# Altium footprint library Roket_Library.PcbLib: 45 footprints (part 1 of 3)
Each footprint in its own frame and in the unit in brackets; x right, y up, seen from the top. Pads: shape width x height; smd on the part's side, far side on the other; paste and mask are expansions set on the pad; w line width, h text height; cw(c..) or ccw(c..) is an arc to the next point about the centre after c.
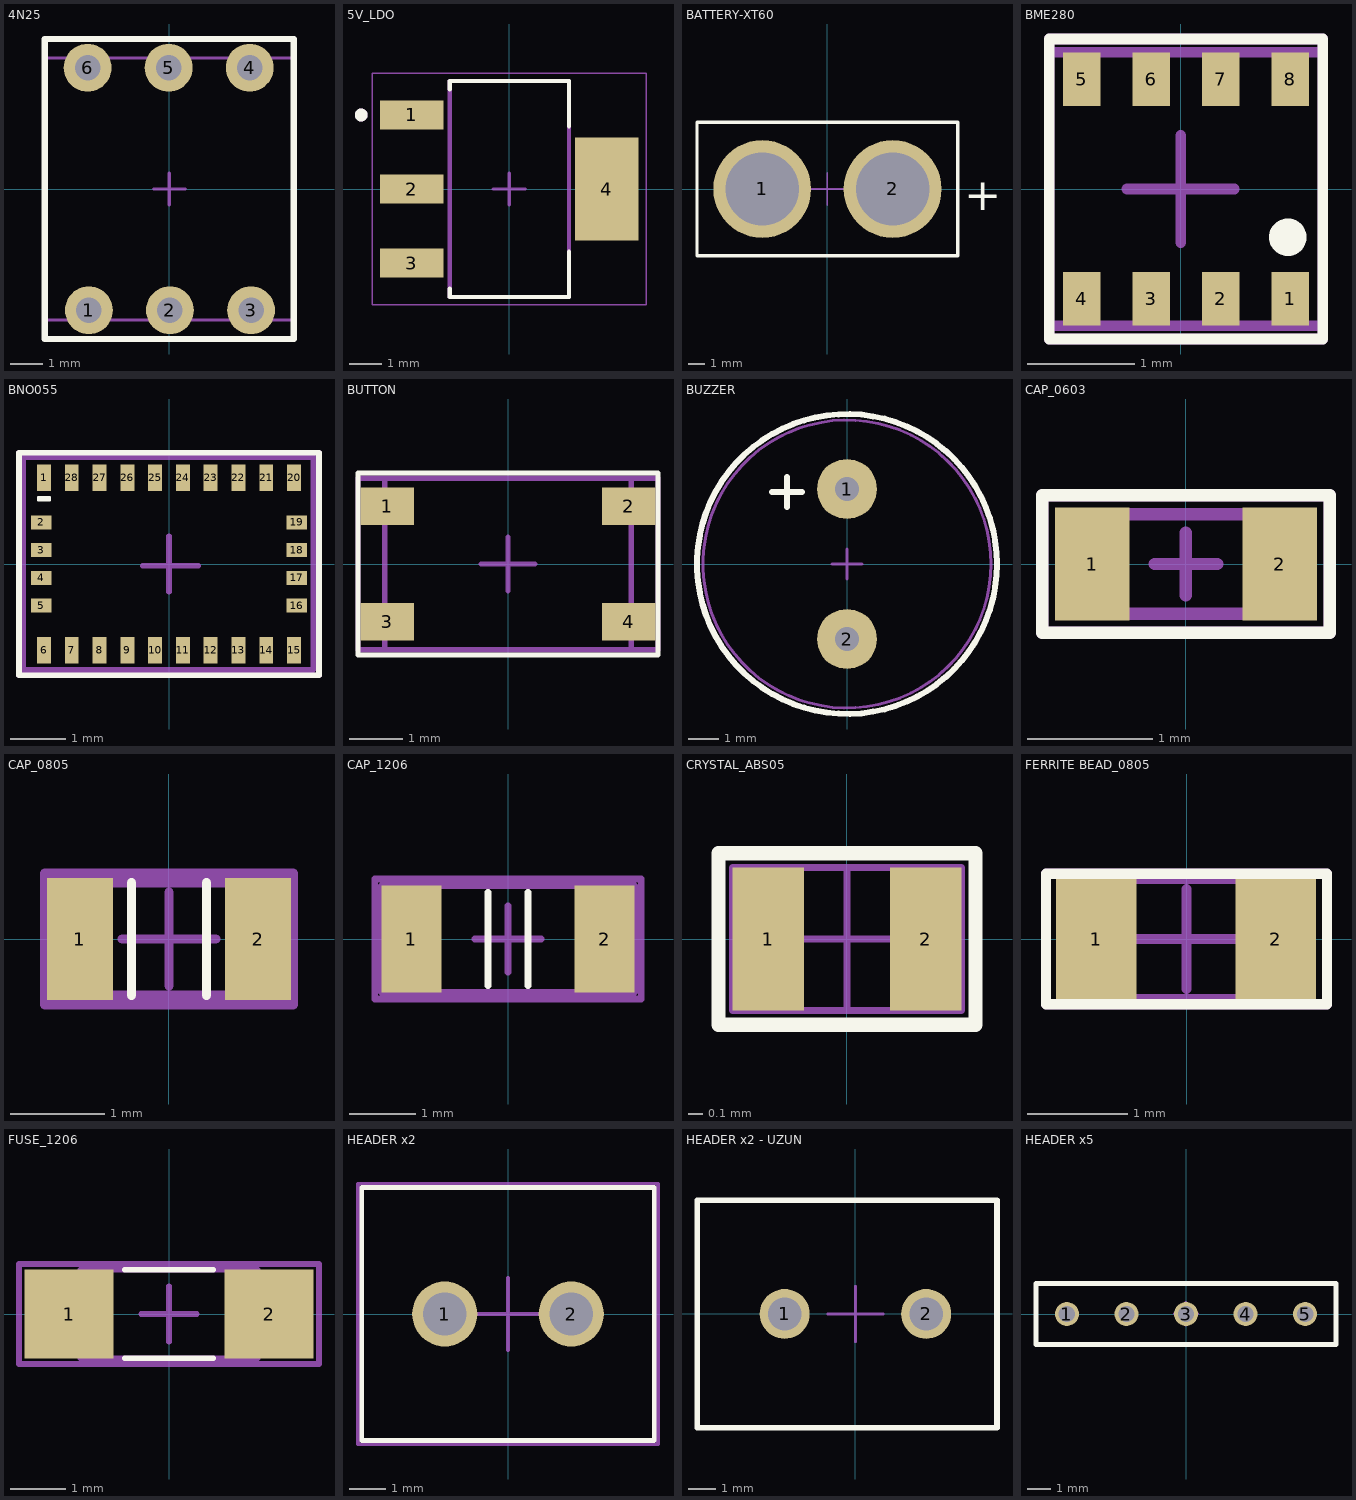
[diagram p0: the footprints below, top view; thin cyan lines are the x and y axes]

## 4N25 [mm]
pads (6):
  round 1.5 hole 0.8 mask+0.05: 1(-2.52,-3.8) 2(0.02,-3.8) 3(2.56,-3.8) 4(2.52,3.8) 5(-0.02,3.8) 6(-2.56,3.8)
Top Overlay:
  lines w0.2: -3.9,-4.7 -3.9,4.7 3.9,4.7 3.9,-4.7 -3.9,-4.7
Top 3D Body:
  lines w0.1: -3.92,-4.1 -3.92,4.1 3.88,4.1 3.88,-4.1 -3.92,-4.1
Top Component Center:
  lines w0.1: -0.5,0 0.5,0 ; 0,-0.5 0,0.5 ; -3.92,-4.7 -3.92,4.7 3.88,4.7 3.88,-4.7 -3.92,-4.7
Top Designator:
  lines w0.1: -3.92,-4.7 3.88,-4.7 3.88,4.7 -3.92,4.7 -3.92,-4.7
  text "'.Designator'" at -3.3,-0.5 h0.6
3D body "4N25.STEP": height 4.56, standoff -3.16, extent -3.89,-4.06 3.91,4.061

## 5V_LDO [mm]
pads (4):
  rect 1.97x0.89 smd mask+0.05: 1(-3.025,2.3) 2(-3.025,0) 3(-3.025,-2.3)
  rect 1.97x3.19 smd mask+0.05: 4(3.025,0)
Top Overlay:
  circle w0.2: c-4.6,2.3 r0.1
  lines w0.127: -1.85,-3.1 -1.85,-3.35 1.85,-3.35 1.85,-1.95 ; -1.85,3.1 -1.85,3.35 1.85,3.35 1.85,1.95
Top 3D Body:
  circle w0.2: c-4.6,2.3 r0.1
  lines w0.127: -1.85,-3.35 -1.85,3.35 1.85,3.35 1.85,-3.35 -1.85,-3.35
Top Component Center:
  lines w0.05: -4.26,-3.6 -4.26,3.6 -2.1,3.6 2.1,3.6 4.26,3.6 4.26,-1.88 4.26,-3.6 2.1,-3.6 -2.1,-3.6 -4.26,-3.6
  lines w0.1: -0.5,0 0.5,0 ; 0,-0.5 0,0.5
Top Designator:
  lines w0.05: -4.26,-3.6 -4.26,3.6 -2.1,3.6 2.1,3.6 4.26,3.6 4.26,-1.88 4.26,-3.6 2.1,-3.6 -2.1,-3.6 -4.26,-3.6
  text "'.Designator'" at -3.6,-0.5 h0.6
3D body "step_temp.STEP": height 1.8, standoff 0, extent -3.499,-3.25 3.499,3.25

## BATTERY-XT60 [mm]
pads (2):
  round 6 hole 4.5 mask+0.05: 1(-4,0) 2(4,0)
Top Overlay:
  lines w0.2: -8,-4.1 -8,4.1 8,4.1 8,-4.1 -8,-4.1
  text "+" at 8.4,-1.3 h2
Top 3D Body:
  lines w0.1: -8,-4.1 -8,4.1 8,4.1 8,-4.1 -8,-4.1
Top Component Center:
  lines w0.1: -1,0 1,0 ; 0,-1 0,1 ; -8,-4.1 -8,4.1 8,4.1 8,-4.1 -8,-4.1
Top Designator:
  lines w0.1: -8,-4.1 -8,4.1 8,4.1 8,-4.1 -8,-4.1
  text "'.Designator'" at -3.9,-0.3 h0.6
3D body "XT60 Female Connector.SLDPRT": height 15.39, standoff -3.44, extent -7.963,-4.069 7.972,4.059

## BME280 [mm]
pads (8):
  rect 0.35x0.5 smd mask+0.05: 1(1.025,-1.025) 2(0.375,-1.025) 3(-0.275,-1.025) 4(-0.925,-1.025) 5(-0.925,1.025) 6(-0.275,1.025) 7(0.375,1.025) 8(1.025,1.025)
Top Overlay:
  circle w0.2: c1,-0.45 r0.075
  lines w0.1: -1.225,-1.4 1.325,-1.4 1.325,1.4 -1.225,1.4 -1.225,-1.4
Top 3D Body:
  lines w0.1: -1.225,-1.275 1.325,-1.275 1.325,1.275 -1.225,1.275 -1.225,-1.275
Top Component Center:
  lines w0.1: -0.5,0 0.5,0 ; 0,-0.5 0,0.5 ; -1.225,-1.4 -1.225,1.4 ; -1.225,-1.4 1.325,-1.4 ; -1.225,-1.4 -1.225,1.4 ; -1.225,-1.4 1.325,-1.4 ; -1.225,1.4 1.325,1.4 ; -1.225,1.4 1.325,1.4 ; 1.325,-1.4 1.325,1.4 ; 1.325,-1.4 1.325,1.4
Top Designator:
  text "'.Designator'" at -1.95,-0.5 h0.6
3D body "User Library-BME280-1.step": height 0.94, standoff 0.01, extent -1.2,-1.25 1.3,1.25

## BNO055 [mm]
pads (28):
  rect 0.25x0.475 smd mask+0.05: 1(-2.25,1.55) 6(-2.25,-1.55) 7(-1.75,-1.55) 8(-1.25,-1.55) 9(-0.75,-1.55) 10(-0.25,-1.55) 11(0.25,-1.55) 12(0.75,-1.55) 13(1.25,-1.55) 14(1.75,-1.55) 15(2.25,-1.55) 20(2.25,1.55) 21(1.75,1.55) 22(1.25,1.55) 23(0.75,1.55) 24(0.25,1.55) 25(-0.25,1.55) 26(-0.75,1.55) 27(-1.25,1.55) 28(-1.75,1.55)
  rect 0.375x0.25 smd mask+0.05: 2(-2.3,0.75) 3(-2.3,0.25) 4(-2.3,-0.25) 5(-2.3,-0.75) 16(2.3,-0.75) 17(2.3,-0.25) 18(2.3,0.25) 19(2.3,0.75)
Top Overlay:
  lines w0.05: -2.353,1.152 -2.145,1.152 -2.145,1.2 -2.353,1.2 -2.353,1.152
  lines w0.1: -2.7,-2 -2.7,2 2.7,2 2.7,-2 -2.7,-2
Top 3D Body:
  lines w0.1: -2.625,-1.9 2.6,-1.9 2.6,1.925 -2.625,1.925 -2.625,-1.9
Top Component Center:
  lines w0.1: -0.472,-0.028 0.528,-0.028 ; 0,-0.5 0,0.5 ; -2.7,-2 2.7,-2 2.7,2 -2.7,2 -2.7,-2
Top Designator:
  lines w0.1: -2.7,-2 2.7,-2 2.7,2 -2.7,2 -2.7,-2
  text "'.Designator'" at -3.2,-0.4 h0.6
3D body "User Library-LGA-28_5_2x3_8_0_5p-1.step": height 1.18, standoff 0, extent -2.6,-1.9 2.6,1.9

## BUTTON [mm]
pads (4):
  rect 1x0.7 smd mask+0.05: 1(-2.25,1.075) 2(2.25,1.075) 3(-2.25,-1.075) 4(2.25,-1.075)
Top Overlay:
  lines w0.1: -2.8,-1.7 -2.8,1.7 2.8,1.7 2.8,-1.7 -2.8,-1.7
Top 3D Body:
  lines w0.1: -2.3,-1.6 -2.3,1.6 2.3,1.6 2.3,-1.6 -2.3,-1.6
Top Component Center:
  lines w0.1: -0.5,0 0.5,0 ; 0,-0.5 0,0.5 ; -2.8,-1.6 2.8,-1.6 2.8,1.6 -2.8,1.6 -2.8,-1.6
Top Designator:
  lines w0.1: -2.8,-1.6 2.8,-1.6 2.8,1.6 -2.8,1.6 -2.8,-1.6
  text "'.Designator'" at -3.4,-0.7 h0.8
3D body "PTS815SJG250SMTRLFS.stp": height 2.5, standoff 0, extent -2.25,-1.6 2.25,1.6

## BUZZER [mm]
pads (2):
  round 2 hole 0.8 mask+0.05: 1(0,2.5) 2(0,-2.5)
Top Overlay:
  circle w0.2: c0,0 r5
  lines w0.2: -2.5,2.4 -1.5,2.4 ; -2,1.9 -2,2.9
Top Component Center:
  circle w0.1: c0,0 r4.8
  lines w0.1: -0.5,0 0.5,0 ; 0,-0.5 0,0.5
Top Designator:
  text "'.Designator'" at -5.525,-0.675 h1
3D body: height 5.2, standoff 5.15, extent -2,1.8 2,5.8
3D body: height 5.2, standoff 5.15, extent -4.3,-4.297 4.3,4.297
3D body: height 0.15, standoff -3.85, extent -0.299,-2.799 0.299,-2.201
3D body: height 0.15, standoff -5.35, extent -0.299,2.201 0.299,2.799
3D body: height 5.1, standoff 0.1, extent -4.8,-4.797 4.8,4.797

## CAP_0603 [mm]
pads (2):
  rect 0.6x0.9 smd mask+0.05: 1(-0.75,0) 2(0.75,0)
Top Overlay:
  lines w0.1: -1.15,-0.55 1.15,-0.55 1.15,0.55 -1.15,0.55 -1.15,-0.55
Top 3D Body:
  lines w0.1: -0.8,-0.4 -0.8,0.4 0.8,0.4 0.8,-0.4 -0.8,-0.4
Top Component Center:
  lines w0.1: -0.25,0 0.25,0 ; 0,-0.25 0,0.25 ; -1.15,-0.55 -1.15,0.55 1.15,0.55 1.15,-0.55 -1.15,-0.55
Top Designator:
  lines w0.1: -1.15,-0.55 1.15,-0.55 1.15,0.55 -1.15,0.55 -1.15,-0.55
  text "'.Designator'" at -1.15,-0.55 h0.5
3D body "CAPC0603 v1.step": height 0.5, standoff 0, extent -0.8,-0.4 0.8,0.4

## CAP_0805 [mm]
pads (2):
  rect 0.7x1.3 smd mask+0.05: 1(-0.95,0) 2(0.95,0)
Top Overlay:
  lines w0.1: -0.4,-0.6 -0.4,0.6 ; 0.4,-0.6 0.4,0.6
Top 3D Body:
  lines w0.1: -1,-0.6 1,-0.6 1,0.6 -1,0.6 -1,-0.6
Top Component Center:
  lines w0.1: -0.5,0 0.5,0 ; 0,-0.5 0,0.5 ; -1.325,-0.7 -1.325,0.7 1.325,0.7 1.325,-0.7 -1.325,-0.7
Top Designator:
  lines w0.1: -1.3,-0.65 1.3,-0.65 1.3,0.65 -1.3,0.65 -1.3,-0.65
  text "'.Designator'" at -1.3,-0.5 h0.5
3D body "CAPC0805 v2.step": height 1, standoff 0, extent -1,-0.6 1,0.6

## CAP_1206 [mm]
pads (2):
  rect 0.9x1.6 smd mask+0.05: 1(-1.45,0) 2(1.45,0)
Top Overlay:
  lines w0.1: -0.3,-0.7 -0.3,0.7 ; 0.3,-0.7 0.3,0.7
Top 3D Body:
  lines w0.1: -1.6,-0.8 1.6,-0.8 1.6,0.8 -1.6,0.8 -1.6,-0.8
Top Component Center:
  lines w0.1: -0.5,0 0.5,0 ; 0,-0.5 0,0.5 ; -2,-0.9 -2,0.9 2,0.9 2,-0.9 -2,-0.9
Top Designator:
  lines w0.1: -1.9,-0.8 -1.9,0.8 1.9,0.8 1.9,-0.8 -1.9,-0.8
  text "'.Designator'" at -2,-0.5 h0.5
3D body "CAPC1206 v2.step": height 1, standoff 0, extent -1.6,-0.8 1.6,0.8

## CRYSTAL_ABS05 [mm]
pads (2):
  rect 0.5x1 smd mask+0.05: 1(-0.55,0) 2(0.55,0)
Top Overlay:
  lines w0.1: -0.9,-0.6 -0.9,0.6 0.9,0.6 0.9,-0.6 -0.9,-0.6
Top 3D Body:
  lines w0.05: -0.8,-0.5 -0.8,0.5 0.8,0.5 0.8,-0.5 -0.8,-0.5
Top Component Center:
  lines w0.05: -0.5,0 0.5,0 ; 0,-0.5 0,0.5 ; -0.9,-0.6 -0.9,0.6 0.9,0.6 0.9,-0.6 -0.9,-0.6
Top Designator:
  lines w0.05: -0.9,-0.6 0.9,-0.6 0.9,0.6 -0.9,0.6 -0.9,-0.6
  text "'.Designator'" at -1.4,-0.4 h0.4
3D body "ABS05-32.768KHZ-T--3DModel-STEP-400430.STEP": height 0.52, standoff 0.01, extent -0.8,-0.5 0.8,0.5

## FERRITE BEAD_0805 [mm]
pads (2):
  rect 0.8x1.2 smd mask+0.05: 1(-0.9,0) 2(0.889,0)
Top Overlay:
  lines w0.1: -1.4,-0.65 -1.4,0.65 1.4,0.65 1.4,-0.65 -1.4,-0.65
Top 3D Body:
  lines w0.1: -1,-0.6 -1,0.6 1,0.6 1,-0.6 -1,-0.6
Top Component Center:
  lines w0.1: -0.5,0 0.5,0 ; 0,-0.5 0,0.5 ; -1.4,-0.65 -1.4,0.65 1.4,0.65 1.4,-0.65 -1.4,-0.65
Top Designator:
  lines w0.1: -1.4,-0.65 -1.4,0.65 1.4,0.65 1.4,-0.65 -1.4,-0.65
  text "'.Designator'" at -2,-0.5 h0.6
3D body "ferrite_bead_0805.STEP": height 0.91, standoff 0.01, extent -1,-0.6 1,0.6

## FUSE_1206 [mm]
pads (2):
  rect 1.6x1.6 smd mask+0.05: 1(-1.8,0) 2(1.8,0)
Top Overlay:
  lines w0.1: -0.8,-0.8 0.8,-0.8 ; -0.8,0.8 0.8,0.8
Top 3D Body:
  lines w0.1: -1.6,-0.8 -1.6,0.8 1.6,0.8 1.6,-0.8 -1.6,-0.8
Top Component Center:
  lines w0.1: -0.5,0 0.5,0 ; 0,-0.5 0,0.5 ; -2.7,-0.9 -2.7,0.9 2.7,0.9 2.7,-0.9 -2.7,-0.9
Top Designator:
  lines w0.1: -2.7,-0.9 -2.7,0.9 2.7,0.9 2.7,-0.9 -2.7,-0.9
  text "'.Designator'" at -2.2,-0.8 h0.8
3D body "e_0100.3479_003.step": height 0.6, standoff -0.04, extent -1.612,-0.8 1.612,0.8

## HEADER x2 [mm]
pads (2):
  round 1.8 hole 1.2: 1(-1.75,0) 2(1.75,0)
Top Overlay:
  lines w0.127: -4.05,-3.5 -4.05,3.5 4.05,3.5 4.05,-3.5 -4.05,-3.5
Top Component Center:
  lines w0.1: -1,0 1,0 ; 0,-1 0,1 ; -4.15,-3.6 -4.15,3.6 4.15,3.6 4.15,-3.6 -4.15,-3.6
Top Designator:
  lines w0.1: -4.15,-3.6 4.15,-3.6 4.15,3.6 -4.15,3.6 -4.15,-3.6
  text "'.Designator'" at -4.875,-1.05 h1
3D body "OSTTE020104--3DModel-STEP-56544.STEP": height 8.31, standoff -3.89, extent -4.025,-3.45 3.975,3.55

## HEADER x2 - UZUN [mm]
pads (2):
  round 1.8 hole 1.2: 1(-2.55,0) 2(2.55,0)
Top Overlay:
  lines w0.2: -5.7,-4.1 5.1,-4.1 5.1,4.1 -5.7,4.1 -5.7,-4.1
Top 3D Body:
  lines w0.1: -5.708,-4.106 -5.708,4.094 5.092,4.094 5.092,-4.106 -5.708,-4.106
Top Component Center:
  lines w0.1: -1,0 1,0 ; 0,-1 0,1 ; -5.7,-4.1 -5.7,4.1 5.1,4.1 5.1,-4.1 -5.7,-4.1
Top Designator:
  lines w0.1: -5.7,-4.1 -5.7,4.1 5.1,4.1 5.1,-4.1 -5.7,-4.1
  text "'.Designator'" at -6,-0.7 h1
3D body "12h8403_282837-2.stp": height 9.81, standoff -3.69, extent -5.68,-4.1 5.08,4.1

## HEADER x5 [mm]
pads (5):
  round 1.02 hole 0.7 mask+0.05: 1(-5.08,0) 2(-2.54,0) 3(0,0) 4(2.54,0) 5(5.08,0)
Top Overlay:
  lines w0.2: -6.4,-1.3 6.4,-1.3 6.4,1.3 -6.4,1.3 -6.4,-1.3
Top 3D Body:
  lines w0.1: -6.4,-1.3 6.4,-1.3 6.4,1.3 -6.4,1.3 -6.4,-1.3
Top Component Center:
  lines w0.1: -0.503,0.008 0.497,0.008 ; -0.003,-0.492 -0.003,0.508 ; -6.4,-1.3 6.4,-1.3 6.4,1.3 -6.4,1.3 -6.4,-1.3
Top Designator:
  lines w0.1: -6.4,-1.3 6.4,-1.3 6.4,1.3 -6.4,1.3 -6.4,-1.3
  text "'.Designator'" at -5.73,-1 h1